# Altium footprint library DD2088PoE_Daisy_Chain.PcbLib: 62 footprints (part 2 of 4)
Each footprint in its own frame and in the unit in brackets; x right, y up, seen from the top. Pads: shape width x height; smd on the part's side, far side on the other; paste and mask are expansions set on the pad; w line width, h text height; cw(c..) or ccw(c..) is an arc to the next point about the centre after c.
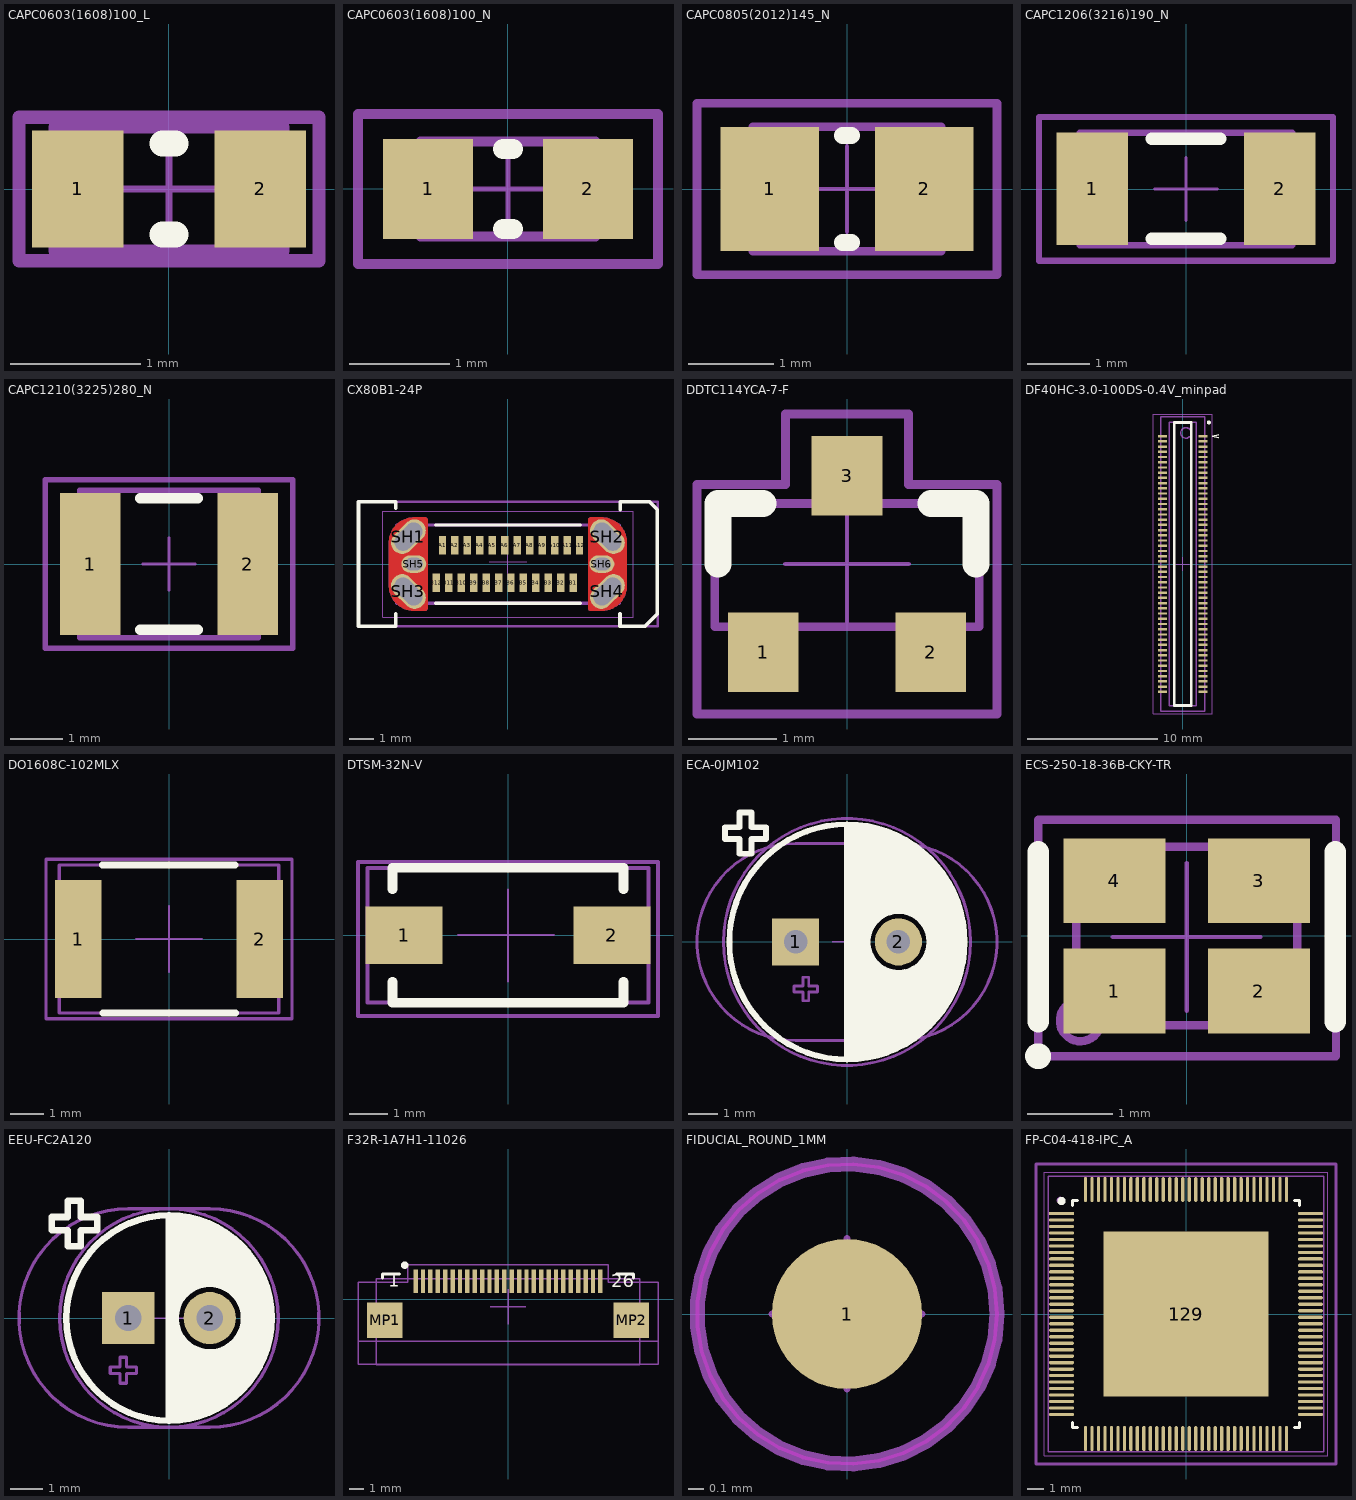
[diagram p1: the footprints below, top view; thin cyan lines are the x and y axes]

## CAPC0603(1608)100_L [mm] "Chip Capacitor, Body 1.6x0.8mm, Height 1.0mm, IPC High Density"
height 1
pads (2):
  rect 0.7x0.9 smd: 1(-0.7,0) 2(0.7,0)
Top Overlay:
  lines w0.2: -0.05,-0.35 0.05,-0.35 ; -0.05,0.35 0.05,0.35
Top Assembly:
  lines w0.1: -1.15,-0.55 -1.15,0.55 1.15,0.55 1.15,-0.55 -1.15,-0.55
  text "'.Designator'" at 0.74,0.283 h1
Top Courtyard:
  lines w0.05: -0.475,0 0.475,0 ; 0,-0.475 0,0.475 ; -1.15,-0.55 1.15,-0.55 1.15,0.55 -1.15,0.55 -1.15,-0.55
Top Component Outline:
  lines w0.1: -0.875,-0.475 -0.875,0.475 0.875,0.475 0.875,-0.475 -0.875,-0.475
3D body: height 1, standoff 0, extent -0.525,-0.475 0.525,0.475
3D body: height 1, standoff 0, extent -0.875,-0.475 -0.525,0.475
3D body: height 1, standoff 0, extent 0.525,-0.475 0.875,0.475

## CAPC0603(1608)100_N [mm] "Chip Capacitor, Body 1.6x0.8mm, Height 1.0mm, IPC Medium Density"
height 1
pads (2):
  rect 0.9x1 smd: 1(-0.8,0) 2(0.8,0)
Top Overlay:
  lines w0.2: -0.05,-0.4 0.05,-0.4 ; -0.05,0.4 0.05,0.4
Top Assembly:
  lines w0.1: -1.5,-0.75 1.5,-0.75 1.5,0.75 -1.5,0.75 -1.5,-0.75
  text "'.Designator'" at -0.8,-0.3 h1
Top Courtyard:
  lines w0.05: -0.475,0 0.475,0 ; 0,-0.475 0,0.475 ; -1.5,-0.75 1.5,-0.75 1.5,0.75 -1.5,0.75 -1.5,-0.75
Top Component Outline:
  lines w0.1: -0.875,-0.475 0.875,-0.475 0.875,0.475 -0.875,0.475 -0.875,-0.475
3D body: height 1, standoff 0, extent -0.525,-0.475 0.525,0.475
3D body: height 1, standoff 0, extent -0.875,-0.475 -0.525,0.475
3D body: height 1, standoff 0, extent 0.525,-0.475 0.875,0.475

## CAPC0805(2012)145_N [mm] "Chip Capacitor, Body 2.0x1.2mm, Height 1.45mm, IPC Medium Density"
height 1.45
pads (2):
  rect 1.15x1.45 smd: 1(-0.9,0) 2(0.9,0)
Top Overlay:
  lines w0.2: -0.05,-0.625 0.05,-0.625 ; -0.05,0.625 0.05,0.625
Top Assembly:
  lines w0.1: -1.75,-1 -1.75,1 1.75,1 1.75,-1 -1.75,-1
  text "'.Designator'" at 0.532,0.307 h1
Top Courtyard:
  lines w0.05: -0.5,0 0.5,0 ; 0,-0.5 0,0.5 ; -1.75,-1 1.75,-1 1.75,1 -1.75,1 -1.75,-1
Top Component Outline:
  lines w0.1: -1.1,-0.725 1.1,-0.725 1.1,0.725 -1.1,0.725 -1.1,-0.725
3D body: height 1.45, standoff 0, extent -0.6,-0.725 0.6,0.725
3D body: height 1.45, standoff 0, extent -1.1,-0.725 -0.6,0.725
3D body: height 1.45, standoff 0, extent 0.6,-0.725 1.1,0.725

## CAPC1206(3216)190_N [mm] "Chip Capacitor, Body 3.2x1.6mm, Height 1.9mm, IPC Medium Density"
height 1.9
pads (2):
  rect 1.15x1.8 smd: 1(-1.5,0) 2(1.5,0)
Top Overlay:
  lines w0.2: -0.55,-0.8 0.55,-0.8 ; -0.55,0.8 0.55,0.8
Top Assembly:
  lines w0.1: -2.35,-1.15 2.35,-1.15 2.35,1.15 -2.35,1.15 -2.35,-1.15
  text "'.Designator'" at -0.875,-0.4 h1
Top Courtyard:
  lines w0.05: -0.5,0 0.5,0 ; 0,-0.5 0,0.5 ; -2.35,-1.15 -2.35,1.15 2.35,1.15 2.35,-1.15 -2.35,-1.15
Top Component Outline:
  lines w0.1: -1.7,-0.9 -1.7,0.9 1.7,0.9 1.7,-0.9 -1.7,-0.9
3D body: height 1.9, standoff 0, extent 1.2,-0.9 1.7,0.9
3D body: height 1.9, standoff 0, extent -1.7,-0.9 -1.2,0.9
3D body: height 1.9, standoff 0, extent -1.2,-0.9 1.2,0.9

## CAPC1210(3225)280_N [mm] "Chip Capacitor, Body 3.2x2.5mm, Height 2.8mm, IPC Medium Density"
height 2.8
pads (2):
  rect 1.15x2.7 smd: 1(-1.5,0) 2(1.5,0)
Top Overlay:
  lines w0.2: -0.55,-1.25 0.55,-1.25 ; -0.55,1.25 0.55,1.25
Top Assembly:
  lines w0.1: -2.35,-1.6 -2.35,1.6 2.35,1.6 2.35,-1.6 -2.35,-1.6
  text "'.Designator'" at -0.3,0.575 h1
Top Courtyard:
  lines w0.05: -0.5,0 0.5,0 ; 0,-0.5 0,0.5 ; -2.35,-1.6 2.35,-1.6 2.35,1.6 -2.35,1.6 -2.35,-1.6
Top Component Outline:
  lines w0.1: -1.7,-1.4 1.7,-1.4 1.7,1.4 -1.7,1.4 -1.7,-1.4
3D body: height 2.8, standoff 0, extent -1.2,-1.4 1.2,1.4
3D body: height 2.8, standoff 0, extent -1.7,-1.4 -1.2,1.4
3D body: height 2.8, standoff 0, extent 1.2,-1.4 1.7,1.4

## CX80B1-24P [mm] "USB3.1 Type-C Molex SMT, Through Hole, Vertical"
height 5
pads (30):
  rect 0.3x0.75 smd: A1(-2.625,0.755) A2(-2.125,0.755) A3(-1.625,0.755) A4(-1.125,0.755) A5(-0.625,0.755) A6(-0.125,0.755) A7(0.375,0.755) A8(0.875,0.755) A9(1.375,0.755) A10(1.875,0.755) A11(2.375,0.755) A12(2.875,0.755) B1(2.625,-0.755) B2(2.125,-0.755) B3(1.625,-0.755) B4(1.125,-0.755) B5(0.625,-0.755) B6(0.125,-0.755) B7(-0.375,-0.755) B8(-0.875,-0.755) B9(-1.375,-0.755) B10(-1.875,-0.755) B11(-2.375,-0.755) B12(-2.875,-0.755)
  oval 1.6x0.9 hole 0.7 slot 1.3 at 45 deg rot 45: SH1(-3.995,1.1) SH4(3.995,-1.1)
  oval 1.6x0.9 hole 0.7 slot 1.3 at 135 deg rot 135: SH2(3.995,1.1) SH3(-3.995,-1.1)
  oval 1x0.7 hole 0.5 slot 0.7 at 0 deg: SH5(-3.775,0) SH6(3.775,0)
Top Layer:
  region: 3.827,1.873 3.88,1.869 3.931,1.862 3.983,1.853 4.034,1.84 4.084,1.826 4.133,1.808 4.182,1.788 4.229,1.766 4.275,1.741 4.32,1.713 4.363,1.684 4.404,1.652 4.444,1.618 4.482,1.582 4.518,1.544 4.552,1.504 4.584,1.462 4.614,1.419 4.641,1.375 4.666,1.329 4.689,1.281 4.709,1.233 4.726,1.184 4.741,1.133 4.753,1.082 4.763,1.031 4.77,0.979 4.774,0.927 4.775,0.875 4.775,-0.875 4.774,-0.928 4.77,-0.98 4.763,-1.032 4.753,-1.083 4.741,-1.134 4.726,-1.185 4.709,-1.234 4.689,-1.282 4.666,-1.329 4.641,-1.375 4.614,-1.42 4.584,-1.463 4.552,-1.505 4.518,-1.545 4.482,-1.583 4.444,-1.619 4.404,-1.653 4.363,-1.685 4.32,-1.714 4.275,-1.742 4.229,-1.766 4.182,-1.789 4.133,-1.809 4.084,-1.827 4.034,-1.841 3.983,-1.854 3.931,-1.863 3.88,-1.87 3.827,-1.874 3.775,-1.875 3.325,-1.875 3.32,-1.875 3.315,-1.875 3.309,-1.874 3.304,-1.873 3.299,-1.872 3.294,-1.871 3.289,-1.869 3.284,-1.867 3.28,-1.865 3.275,-1.862 3.271,-1.859 3.266,-1.856 3.262,-1.853 3.258,-1.85 3.254,-1.846 3.251,-1.842 3.247,-1.838 3.244,-1.834 3.241,-1.83 3.238,-1.825 3.236,-1.821 3.234,-1.816 3.232,-1.811 3.23,-1.806 3.228,-1.801 3.227,-1.796 3.226,-1.791 3.226,-1.786 3.225,-1.781 3.225,-1.775 3.225,1.775 3.225,1.78 3.226,1.785 3.226,1.79 3.227,1.795 3.228,1.8 3.23,1.805 3.232,1.81 3.234,1.815 3.236,1.82 3.238,1.825 3.241,1.829 3.244,1.833 3.247,1.837 3.251,1.841 3.254,1.845 3.258,1.849 3.262,1.852 3.266,1.855 3.271,1.858 3.275,1.861 3.28,1.864 3.284,1.866 3.289,1.868 3.294,1.87 3.299,1.871 3.304,1.872 3.309,1.873 3.315,1.874 3.32,1.874 3.325,1.875 3.775,1.875
  region: -3.32,1.874 -3.315,1.874 -3.309,1.873 -3.304,1.872 -3.299,1.871 -3.294,1.87 -3.289,1.868 -3.284,1.866 -3.28,1.864 -3.275,1.861 -3.271,1.858 -3.266,1.855 -3.262,1.852 -3.258,1.849 -3.254,1.845 -3.251,1.841 -3.247,1.837 -3.244,1.833 -3.241,1.829 -3.238,1.825 -3.236,1.82 -3.234,1.815 -3.232,1.81 -3.23,1.805 -3.228,1.8 -3.227,1.795 -3.226,1.79 -3.226,1.785 -3.225,1.78 -3.225,1.775 -3.225,-1.775 -3.225,-1.781 -3.226,-1.786 -3.226,-1.791 -3.227,-1.796 -3.228,-1.801 -3.23,-1.806 -3.232,-1.811 -3.234,-1.816 -3.236,-1.821 -3.238,-1.825 -3.241,-1.83 -3.244,-1.834 -3.247,-1.838 -3.251,-1.842 -3.254,-1.846 -3.258,-1.85 -3.262,-1.853 -3.266,-1.856 -3.271,-1.859 -3.275,-1.862 -3.28,-1.865 -3.284,-1.867 -3.289,-1.869 -3.294,-1.871 -3.299,-1.872 -3.304,-1.873 -3.309,-1.874 -3.315,-1.875 -3.32,-1.875 -3.325,-1.875 -3.775,-1.875 -3.827,-1.874 -3.88,-1.87 -3.931,-1.863 -3.983,-1.854 -4.034,-1.841 -4.084,-1.827 -4.133,-1.809 -4.182,-1.789 -4.229,-1.766 -4.275,-1.742 -4.32,-1.714 -4.363,-1.685 -4.404,-1.653 -4.444,-1.619 -4.482,-1.583 -4.518,-1.545 -4.552,-1.505 -4.584,-1.463 -4.614,-1.42 -4.641,-1.375 -4.666,-1.329 -4.689,-1.282 -4.709,-1.234 -4.726,-1.185 -4.741,-1.134 -4.753,-1.083 -4.763,-1.032 -4.77,-0.98 -4.774,-0.928 -4.775,-0.875 -4.775,0.875 -4.774,0.927 -4.77,0.979 -4.763,1.031 -4.753,1.082 -4.741,1.133 -4.726,1.184 -4.709,1.233 -4.689,1.281 -4.666,1.329 -4.641,1.375 -4.614,1.419 -4.584,1.462 -4.552,1.504 -4.518,1.544 -4.482,1.582 -4.444,1.618 -4.404,1.652 -4.363,1.684 -4.32,1.713 -4.275,1.741 -4.229,1.766 -4.182,1.788 -4.133,1.808 -4.084,1.826 -4.034,1.84 -3.983,1.853 -3.931,1.862 -3.88,1.869 -3.827,1.873 -3.775,1.875 -3.325,1.875
Bottom Layer:
  region: -3.32,1.874 -3.315,1.874 -3.309,1.873 -3.304,1.872 -3.299,1.871 -3.294,1.87 -3.289,1.868 -3.284,1.866 -3.28,1.864 -3.275,1.861 -3.271,1.858 -3.266,1.855 -3.262,1.852 -3.258,1.849 -3.254,1.845 -3.251,1.841 -3.247,1.837 -3.244,1.833 -3.241,1.829 -3.238,1.825 -3.236,1.82 -3.234,1.815 -3.232,1.81 -3.23,1.805 -3.228,1.8 -3.227,1.795 -3.226,1.79 -3.226,1.785 -3.225,1.78 -3.225,1.775 -3.225,-1.775 -3.225,-1.781 -3.226,-1.786 -3.226,-1.791 -3.227,-1.796 -3.228,-1.801 -3.23,-1.806 -3.232,-1.811 -3.234,-1.816 -3.236,-1.821 -3.238,-1.825 -3.241,-1.83 -3.244,-1.834 -3.247,-1.838 -3.251,-1.842 -3.254,-1.846 -3.258,-1.85 -3.262,-1.853 -3.266,-1.856 -3.271,-1.859 -3.275,-1.862 -3.28,-1.865 -3.284,-1.867 -3.289,-1.869 -3.294,-1.871 -3.299,-1.872 -3.304,-1.873 -3.309,-1.874 -3.315,-1.875 -3.32,-1.875 -3.325,-1.875 -3.775,-1.875 -3.827,-1.874 -3.88,-1.87 -3.931,-1.863 -3.983,-1.854 -4.034,-1.841 -4.084,-1.827 -4.133,-1.809 -4.182,-1.789 -4.229,-1.766 -4.275,-1.742 -4.32,-1.714 -4.363,-1.685 -4.404,-1.653 -4.444,-1.619 -4.482,-1.583 -4.518,-1.545 -4.552,-1.505 -4.584,-1.463 -4.614,-1.42 -4.641,-1.375 -4.666,-1.329 -4.689,-1.282 -4.709,-1.234 -4.726,-1.185 -4.741,-1.134 -4.753,-1.083 -4.763,-1.032 -4.77,-0.98 -4.774,-0.928 -4.775,-0.875 -4.775,0.875 -4.774,0.927 -4.77,0.979 -4.763,1.031 -4.753,1.082 -4.741,1.133 -4.726,1.184 -4.709,1.233 -4.689,1.281 -4.666,1.329 -4.641,1.375 -4.614,1.419 -4.584,1.462 -4.552,1.504 -4.518,1.544 -4.482,1.582 -4.444,1.618 -4.404,1.652 -4.363,1.684 -4.32,1.713 -4.275,1.741 -4.229,1.766 -4.182,1.788 -4.133,1.808 -4.084,1.826 -4.034,1.84 -3.983,1.853 -3.931,1.862 -3.88,1.869 -3.827,1.873 -3.775,1.875 -3.325,1.875
  region: 3.827,1.873 3.88,1.869 3.931,1.862 3.983,1.853 4.034,1.84 4.084,1.826 4.133,1.808 4.182,1.788 4.229,1.766 4.275,1.741 4.32,1.713 4.363,1.684 4.404,1.652 4.444,1.618 4.482,1.582 4.518,1.544 4.552,1.504 4.584,1.462 4.614,1.419 4.641,1.375 4.666,1.329 4.689,1.281 4.709,1.233 4.726,1.184 4.741,1.133 4.753,1.082 4.763,1.031 4.77,0.979 4.774,0.927 4.775,0.875 4.775,-0.875 4.774,-0.928 4.77,-0.98 4.763,-1.032 4.753,-1.083 4.741,-1.134 4.726,-1.185 4.709,-1.234 4.689,-1.282 4.666,-1.329 4.641,-1.375 4.614,-1.42 4.584,-1.463 4.552,-1.505 4.518,-1.545 4.482,-1.583 4.444,-1.619 4.404,-1.653 4.363,-1.685 4.32,-1.714 4.275,-1.742 4.229,-1.766 4.182,-1.789 4.133,-1.809 4.084,-1.827 4.034,-1.841 3.983,-1.854 3.931,-1.863 3.88,-1.87 3.827,-1.874 3.775,-1.875 3.325,-1.875 3.32,-1.875 3.315,-1.875 3.309,-1.874 3.304,-1.873 3.299,-1.872 3.294,-1.871 3.289,-1.869 3.284,-1.867 3.28,-1.865 3.275,-1.862 3.271,-1.859 3.266,-1.856 3.262,-1.853 3.258,-1.85 3.254,-1.846 3.251,-1.842 3.247,-1.838 3.244,-1.834 3.241,-1.83 3.238,-1.825 3.236,-1.821 3.234,-1.816 3.232,-1.811 3.23,-1.806 3.228,-1.801 3.227,-1.796 3.226,-1.791 3.226,-1.786 3.225,-1.781 3.225,-1.775 3.225,1.775 3.225,1.78 3.226,1.785 3.226,1.79 3.227,1.795 3.228,1.8 3.23,1.805 3.232,1.81 3.234,1.815 3.236,1.82 3.238,1.825 3.241,1.829 3.244,1.833 3.247,1.837 3.251,1.841 3.254,1.845 3.258,1.849 3.262,1.852 3.266,1.855 3.271,1.858 3.275,1.861 3.28,1.864 3.284,1.866 3.289,1.868 3.294,1.87 3.299,1.871 3.304,1.872 3.309,1.873 3.315,1.874 3.32,1.874 3.325,1.875 3.775,1.875
Top Overlay:
  lines w0.127: -2.905,-1.57 2.905,-1.57 ; -2.905,1.57 2.905,1.57
  lines w0.15: -4.5,-1.993 -4.5,-2.5 -6,-2.5 -6,2.5 -4.5,2.5 -4.5,2.238 ; 4.502,-1.991 4.502,-2.5 5.506,-2.5 5.591,-2.415 6,-2.006 6,2.186 5.686,2.5 5.601,2.5 4.506,2.5 4.506,2.18
Top Solder:
  drawing of 2 lines, arcs and shapes, not listed
Bottom Solder:
  drawing of 2 lines, arcs and shapes, not listed
Top Assembly:
  lines w0.1: -5.999,-2.506 -5.999,2.501 6.024,2.501 6.024,-2.506 -5.999,-2.506
  text "'.Designator'" at -0.776,-0.315 h1
Top 3D Body:
  lines w0.127: -4.47,-1.57 -4.47,1.57 4.47,1.57 4.47,-1.57 -4.47,-1.57
Top Courtyard:
  lines w0.05: -0.75,0.085 0,0.085 ; 0,-0.665 0,0.085 ; 0,0.835 0,0.085 ; 0.75,0.085 0,0.085 ; -6.018,-2.488 6.012,-2.488 6.012,2.512 -6.018,2.512 -6.018,-2.488 ; -5.025,-2.125 -5.025,2.125 5.025,2.125 5.025,-2.125 -5.025,-2.125
Top Component Outline:
  lines w0.1: -6.01,-2.492 -6.01,2.504 6.027,2.504 6.027,-2.492 -6.01,-2.492
3D body "CX80B1-24P_3D_STEP.stp": height 7.17, standoff -1.05, extent -5.5,-3.365 5.5,3.635

## DDTC114YCA-7-F [mm] "TO-236-3, SC-59, SOT-23-3"
height 1
pads (3):
  rect 0.8x0.9 smd: 1(-0.95,-1) 2(0.95,-1) 3(0,1)
Top Overlay:
  lines w0.305: -1.461,0 -1.461,0.686 -0.953,0.686 ; 0.952,0.686 1.46,0.686 1.46,0
Top Assembly:
  lines w0.1: -1.7,-1.7 1.7,-1.7 1.7,0.9 0.698,0.9 0.698,1.7 -0.698,1.7 -0.698,0.9 -1.7,0.9 -1.7,-1.7
  text "'.Designator'" at -0.296,0.227 h1
Top Courtyard:
  lines w0.05: -0.698,0 0.002,0 ; -0.002,0 0.698,0 ; 0,-0.698 0,0.002 ; 0,0 0,0.7 ; -1.7,-1.7 1.7,-1.7 1.7,0.9 0.698,0.9 0.698,1.7 -0.698,1.7 -0.698,0.9 -1.7,0.9 -1.7,-1.7
Top Component Outline:
  lines w0.1: -1.499,-0.711 -1.499,0.686 1.499,0.686 1.499,-0.711 -1.499,-0.711
3D body: height 1.1, standoff 0, extent -1.5,-0.7 1.5,0.7
3D body: height 0.5, standoff 0, extent -0.15,0.7 0.15,1.1
3D body: height 0.5, standoff 0, extent 0.8,-1.1 1.1,-0.7
3D body: height 0.5, standoff 0, extent -1.1,-1.1 -0.8,-0.7

## DF40HC-3.0-100DS-0.4V_minpad [mm] "3.0MM MATED HEIGHT CONN HDR 100POS 0.4MM SMD GOLD"
height 2.9
pads (100):
  rect 0.7x0.18 smd: 1(1.54,9.8) 2(-1.54,9.8) 3(1.54,9.4) 4(-1.54,9.4) 5(1.54,9) 6(-1.54,9) 7(1.54,8.6) 8(-1.54,8.6) 9(1.54,8.2) 10(-1.54,8.2) 11(1.54,7.8) 12(-1.54,7.8) 13(1.54,7.4) 14(-1.54,7.4) 15(1.54,7) 16(-1.54,7) 17(1.54,6.6) 18(-1.54,6.6) 19(1.54,6.2) 20(-1.54,6.2) 21(1.54,5.8) 22(-1.54,5.8) 23(1.54,5.4) 24(-1.54,5.4) 25(1.54,5) 26(-1.54,5) 27(1.54,4.6) 28(-1.54,4.6) 29(1.54,4.2) 30(-1.54,4.2) 31(1.54,3.8) 32(-1.54,3.8) 33(1.54,3.4) 34(-1.54,3.4) 35(1.54,3) 36(-1.54,3) 37(1.54,2.6) 38(-1.54,2.6) 39(1.54,2.2) 40(-1.54,2.2) 41(1.54,1.8) 42(-1.54,1.8) 43(1.54,1.4) 44(-1.54,1.4) 45(1.54,1) 46(-1.54,1) 47(1.54,0.6) 48(-1.54,0.6) 49(1.54,0.2) 50(-1.54,0.2) 51(1.54,-0.2) 52(-1.54,-0.2) 53(1.54,-0.6) 54(-1.54,-0.6) 55(1.54,-1) 56(-1.54,-1) 57(1.54,-1.4) 58(-1.54,-1.4) 59(1.54,-1.8) 60(-1.54,-1.8) 61(1.54,-2.2) 62(-1.54,-2.2) 63(1.54,-2.6) 64(-1.54,-2.6) 65(1.54,-3) 66(-1.54,-3) 67(1.54,-3.4) 68(-1.54,-3.4) 69(1.54,-3.8) 70(-1.54,-3.8) 71(1.54,-4.2) 72(-1.54,-4.2) 73(1.54,-4.6) 74(-1.54,-4.6) 75(1.54,-5) 76(-1.54,-5) 77(1.54,-5.4) 78(-1.54,-5.4) 79(1.54,-5.8) 80(-1.54,-5.8) 81(1.54,-6.2) 82(-1.54,-6.2) 83(1.54,-6.6) 84(-1.54,-6.6) 85(1.54,-7) 86(-1.54,-7) 87(1.54,-7.4) 88(-1.54,-7.4) 89(1.54,-7.8) 90(-1.54,-7.8) 91(1.54,-8.2) 92(-1.54,-8.2) 93(1.54,-8.6) 94(-1.54,-8.6) 95(1.54,-9) 96(-1.54,-9) 97(1.54,-9.4) 98(-1.54,-9.4) 99(1.54,-9.8) 100(-1.54,-9.8)
Top Overlay:
  circle w0.254: c2,10.85 r0.025
  lines w0.102: 2.75,9.685 2.25,9.8 2.75,9.915
  lines w0.2: -0.65,-10.85 0.65,-10.85 0.65,10.85 -0.65,10.85 -0.65,-10.85
Top Assembly:
  circle w0.1: c0.25,10.05 r0.4
  lines w0.1: -1.05,-10.85 1.05,-10.85 1.05,10.85 -1.05,10.85 -1.05,-10.85
  text "'.Designator'" at -0.4,0.776 h1
Top Courtyard:
  lines w0.05: -0.5,0 0.5,0 ; 0,-0.5 0,0.5 ; -2.25,-11.5 -2.25,11.5 2.25,11.5 2.25,-11.5 -2.25,-11.5
Top Component Outline:
  lines w0.1: -1.69,-11.305 -1.69,11.295 1.69,11.295 1.69,-11.305 -1.69,-11.305
3D body "DF40HC(3.0)-100DS-0.4V.stp": height 2.85, standoff -0.05, extent -1.69,-11.305 1.69,11.295

## DO1608C-102MLX [mm] "Coil inductor 6.6x4.45mm"
height 2.92
pads (2):
  rect 1.4x3.56 smd: 1(-2.73,0) 2(2.73,0)
Top Overlay:
  lines w0.2: -2.007,2.225 1.993,2.225 ; -1.993,-2.225 2.007,-2.225
Top Assembly:
  lines w0.1: -3.7,-2.4 3.7,-2.4 3.7,2.4 -3.7,2.4 -3.7,-2.4
  text "'.Designator'" at -0.27,0.575 h1
Top Courtyard:
  lines w0.05: -1,0 0,0 ; 0,-1 0,0 ; 0,1 0,0 ; 1,0 0,0 ; -3.7,-2.4 3.7,-2.4 3.7,2.4 -3.7,2.4 -3.7,-2.4
Top Component Outline:
  lines w0.1: -3.3,-2.225 3.3,-2.225 3.3,2.225 -3.3,2.225 -3.3,-2.225
3D body "Coilcraft-DO1608C.STEP": height 2.92, standoff -0.01, extent -3.3,-2.225 3.3,2.225

## DTSM-32N-V [mm] "tactile button 160gf"
height 5
pads (2):
  rect 2x1.5 smd: 1(-2.7,0) 2(2.7,0)
Top Overlay:
  lines w0.254: -3.005,-1.209 -3,-1.759 3,-1.759 3,-1.209 ; -3.005,1.75 -3,1.191 ; -3,1.75 3,1.75 3,1.191
Top Assembly:
  lines w0.1: -3.9,-2.1 -3.9,1.9 3.9,1.9 3.9,-2.1 -3.9,-2.1
  text "'.Designator'" at 0.8,0.3 h1
Top Courtyard:
  lines w0.05: -1.3,0 0,0 ; 0,-1.209 0,0 ; 0,1.191 0,0 ; 1.2,0 0,0 ; -3.9,-2.1 -3.9,1.9 3.9,1.9 3.9,-2.1 -3.9,-2.1
Top Component Outline:
  lines w0.1: -3.65,-1.75 -3.65,1.75 3.65,1.75 3.65,-1.75 -3.65,-1.75
3D body "4341x3.stp": height 5, standoff 0, extent -3.65,-1.75 3.65,1.75

## ECA-0JM102 [mm] "Body diameter: 8mm, lead pitch: 3.5mm"
height 16
pads (2):
  rect 1.6x1.6 / inner round 1.6 / far side rect 1.6x1.6 hole 0.8 mask+0.05: 1(-1.75,0)
  round 1.6 hole 0.8 mask+0.05: 2(1.75,0)
Top Overlay:
  circle w0.2: c0,0 r4
  circle w0.1: c1.75,0 r1
  region: 0,4 0,0 0.75,0 0.762,0.104 0.816,0.305 0.909,0.492 1.036,0.658 1.193,0.795 1.373,0.899 1.571,0.966 1.778,0.993 1.882,0.991 1.973,0.977 2.147,0.923 2.308,0.835 2.449,0.718 2.51,0.65 2.567,0.582 2.66,0.431 2.721,0.264 2.749,0.089 2.75,0 4,0 4,0.262 3.932,0.782 3.796,1.289 3.595,1.773 3.333,2.227 3.014,2.643 2.643,3.014 2.227,3.333 1.773,3.595 1.289,3.796 0.782,3.932 0.262,4
  region: 0,-4 0,0 0.75,0 0.759,-0.131 0.826,-0.383 0.957,-0.609 1.141,-0.793 1.367,-0.924 1.619,-0.991 1.881,-0.991 2.133,-0.924 2.359,-0.793 2.543,-0.609 2.674,-0.383 2.741,-0.131 2.75,0 4,0 4,-0.262 3.932,-0.782 3.796,-1.289 3.595,-1.773 3.333,-2.227 3.014,-2.643 2.643,-3.014 2.227,-3.333 1.773,-3.595 1.289,-3.796 0.782,-3.932 0.262,-4
  lines w0.2: -4.15,3.5 -3.65,3.5 -3.65,3 -3.25,3 -3.25,3.5 -2.75,3.5 -2.75,3.9 -3.25,3.9 -3.25,4.4 -3.65,4.4 -3.65,3.9 -4.15,3.9 -4.15,3.5
  lines w0.203: 0,-4 0,4
Top Assembly:
  circle w0.1: c0,0 r4.2
  lines w0.1: -1.8,-1.7 -1.5,-1.7 -1.5,-2 -1.3,-2 -1.3,-1.7 -1,-1.7 -1,-1.5 -1.3,-1.5 -1.3,-1.2 -1.5,-1.2 -1.5,-1.5 -1.8,-1.5 -1.8,-1.7 ; 1,-1.7 1.8,-1.7 1.8,-1.5 1,-1.5 1,-1.7
  text "'.Designator'" at 0,0 h1
Top Courtyard:
  circle w0.05: c0,0 r4.2
  lines w0.05: -0.5,0 0.5,0 ; 0,-0.5 0,0.5
Bottom Courtyard:
  lines w0.1: -1.75,-3.35 cw(c-1.75,0) -1.75,3.35 1.75,3.35 cw(c1.75,0) 1.75,-3.35 -1.75,-3.35
Top Component Outline:
  circle w0.1: c0,0 r4
3D body "ELCO-D8P3.5H11.5LD0.6.stp": height 12.5, standoff -2, extent -4,-4 4,4

## ECS-250-18-36B-CKY-TR [mm] "2.5x2.0mm ceramic SMD"
height 0.6
pads (4):
  rect 1.2x1 smd: 1(-0.85,-0.65) 2(0.85,-0.65) 3(0.85,0.65) 4(-0.85,0.65)
Top Overlay:
  circle w0.254: c-1.748,-1.416 r0.025
  lines w0.254: -1.748,-1.011 -1.748,0.989 ; 1.752,-1.011 1.752,-0.011 1.752,0.989
Top Assembly:
  circle w0.1: c-1.25,-0.998 r0.242
  lines w0.1: -1.748,-1.416 1.759,-1.416 1.759,1.37 -1.748,1.37 -1.748,-1.416
  text "'.Designator'" at -0.776,-0.4 h1
Top Courtyard:
  lines w0.05: -1.748,0.989 -1.748,1.37 ; -0.87,-0.011 0,-0.011 ; 0,-0.881 0,-0.011 ; 0,0.859 0,-0.011 ; 0.87,-0.011 0,-0.011 ; -1.748,1.37 1.759,1.37 1.759,-1.416 -1.748,-1.416 -1.748,1.37
Top Component Outline:
  lines w0.1: -1.3,-1.05 1.3,-1.05 1.3,1.05 -1.3,1.05 -1.3,-1.05
3D body: height 0.6, standoff 0, extent -1.3,-1.05 1.3,1.05

## EEU-FC2A120 [mm] "Body diameter: 6.3mm, lead pitch: 2.5mm"
height 12.2
pads (2):
  rect 1.6x1.6 / inner round 1.6 / far side rect 1.6x1.6 hole 0.8 mask+0.05: 1(-1.25,0)
  round 1.6 hole 0.8 mask+0.05: 2(1.25,0)
Top Overlay:
  circle w0.1: c1.25,0 r1
  circle w0.2: c0,0 r3.15
  region: 0,-3.15 0,0 0.25,0 0.259,-0.131 0.326,-0.383 0.457,-0.609 0.641,-0.793 0.867,-0.924 1.119,-0.991 1.381,-0.991 1.633,-0.924 1.859,-0.793 2.043,-0.609 2.174,-0.383 2.241,-0.131 2.25,0 3.15,0 3.15,-0.206 3.096,-0.616 2.989,-1.015 2.831,-1.396 2.625,-1.754 2.373,-2.081 2.081,-2.373 1.754,-2.625 1.396,-2.831 1.015,-2.989 0.616,-3.096 0.206,-3.15
  region: 0,3.15 0,0 0.25,0 0.259,0.131 0.326,0.383 0.457,0.609 0.641,0.793 0.867,0.924 1.119,0.991 1.381,0.991 1.633,0.924 1.859,0.793 2.043,0.609 2.174,0.383 2.241,0.131 2.25,0 3.15,0 3.15,0.206 3.096,0.616 2.989,1.015 2.831,1.396 2.625,1.754 2.373,2.081 2.081,2.373 1.754,2.625 1.396,2.831 1.015,2.989 0.616,3.096 0.206,3.15
  lines w0.2: -3.6,2.7 -3.6,3.1 -3.1,3.1 -3.1,3.6 -2.7,3.6 -2.7,3.1 -2.2,3.1 -2.2,2.7 -2.7,2.7 -2.7,2.2 -3.1,2.2 -3.1,2.7 -3.6,2.7
  lines w0.203: 0,-3.15 0,3.15
Top Assembly:
  circle w0.1: c0,0 r3.35
  lines w0.1: -1.8,-1.7 -1.8,-1.5 -1.5,-1.5 -1.5,-1.2 -1.3,-1.2 -1.3,-1.5 -1,-1.5 -1,-1.7 -1.3,-1.7 -1.3,-2 -1.5,-2 -1.5,-1.7 -1.8,-1.7 ; 1,-1.7 1,-1.5 1.8,-1.5 1.8,-1.7 1,-1.7
  text "'.Designator'" at 0.45,0.018 h1
Top Courtyard:
  circle w0.05: c0,0 r3.35
  lines w0.05: -0.5,0 0.5,0 ; 0,-0.5 0,0.5
Bottom Courtyard:
  lines w0.1: -1.25,-3.35 cw(c-1.25,0) -1.25,3.35 1.25,3.35 cw(c1.25,0) 1.25,-3.35 -1.25,-3.35
Top Component Outline:
  circle w0.1: c0,0 r3.15
3D body "EC 6.3x11 P2.5 D0.5.STEP": height 12, standoff -0.8, extent -3.15,-3.15 3.15,3.15

## F32R-1A7H1-11026 [mm] "26pin Molex FFC 0.5mm Bottom"
height 1.2
pads (28):
  rect 0.3x1.6 smd: 1(-6.25,1.225) 2(-5.75,1.225) 3(-5.25,1.225) 4(-4.75,1.225) 5(-4.25,1.225) 6(-3.75,1.225) 7(-3.25,1.225) 8(-2.75,1.225) 9(-2.25,1.225) 10(-1.75,1.225) 11(-1.25,1.225) 12(-0.75,1.225) 13(-0.25,1.225) 14(0.25,1.225) 15(0.75,1.225) 16(1.25,1.225) 17(1.75,1.225) 18(2.25,1.225) 19(2.75,1.225) 20(3.25,1.225) 21(3.75,1.225) 22(4.25,1.225) 23(4.75,1.225) 24(5.25,1.225) 25(5.75,1.225) 26(6.25,1.225)
  rect 2.4x2.4 smd: MP1(-8.35,-1.425) MP2(8.35,-1.425)
Top Overlay:
  circle w0.25: c-6.986,2.311 r0.125
  lines w0.2: -8.485,1.451 -8.485,1.705 -7.342,1.705 ; 7.342,1.705 8.485,1.705 8.485,1.451
  text "1" at -8.1,0.55 h1.52
  text "26" at 7,0.5 h1.52
Top Assembly:
  lines w0.1: -10.15,-4.394 10.15,-4.394 10.15,1.143 6.771,1.143 6.771,2.35 -6.771,2.35 -6.771,1.143 -10.15,1.143 -10.15,-4.394
  text "'.Designator'" at -3.302,-1.321 h1.52
Top Courtyard:
  lines w0.1: -10.15,-2.83 10.15,-2.83 ; -1.2,-0.5 0,-0.5 ; 0,-1.7 0,-0.5 ; 0,0.7 0,-0.5 ; 1.2,-0.5 0,-0.5 ; -10.15,-4.394 10.15,-4.394 10.15,1.143 6.771,1.143 6.771,2.35 -6.771,2.35 -6.771,1.143 -10.15,1.143 -10.15,-4.394
Top Component Outline:
  lines w0.1: -8.9,-4.42 8.9,-4.42 8.9,1.397 -8.9,1.397 -8.9,-4.42
3D body "f32r_26pin_asm.stp": height 2.08, standoff -0.02, extent -10.156,-4.475 10.144,1.025

## FIDUCIAL_ROUND_1MM [mm] "Round, 1mm dia"
height 17
pads (1):
  round 1 smd paste-1 mask+0.5: 1(0,0)
Top Layer keep-out:
  circle w0.025: c0,0 r1
Top Assembly:
  circle w0.1: c0,0 r1
  text "'.Designator'" at -0.344,0.869 h1
Top Courtyard:
  circle w0.05: c0,0 r1
  lines w0.05: -0.5,0 0.5,0 ; 0,-0.5 0,0.5

## FP-C04-418-IPC_A [mm]
pads (129):
  rect 1.54x0.2 smd paste+0 mask+0: 1(-7.675,6.2)
  rrect100% 1.54x0.2 smd paste+0 mask+0: 2(-7.675,5.8) 3(-7.675,5.4) 4(-7.675,5) 5(-7.675,4.6) 6(-7.675,4.2) 7(-7.675,3.8) 8(-7.675,3.4) 9(-7.675,3) 10(-7.675,2.6) 11(-7.675,2.2) 12(-7.675,1.8) 13(-7.675,1.4) 14(-7.675,1) 15(-7.675,0.6) 16(-7.675,0.2) 17(-7.675,-0.2) 18(-7.675,-0.6) 19(-7.675,-1) 20(-7.675,-1.4) 21(-7.675,-1.8) 22(-7.675,-2.2) 23(-7.675,-2.6) 24(-7.675,-3) 25(-7.675,-3.4) 26(-7.675,-3.8) 27(-7.675,-4.2) 28(-7.675,-4.6) 29(-7.675,-5) 30(-7.675,-5.4) 31(-7.675,-5.8) 32(-7.675,-6.2) 65(7.675,-6.2) 66(7.675,-5.8) 67(7.675,-5.4) 68(7.675,-5) 69(7.675,-4.6) 70(7.675,-4.2) 71(7.675,-3.8) 72(7.675,-3.4) 73(7.675,-3) 74(7.675,-2.6) 75(7.675,-2.2) 76(7.675,-1.8) 77(7.675,-1.4) 78(7.675,-1) 79(7.675,-0.6) 80(7.675,-0.2) 81(7.675,0.2) 82(7.675,0.6) 83(7.675,1) 84(7.675,1.4) 85(7.675,1.8) 86(7.675,2.2) 87(7.675,2.6) 88(7.675,3) 89(7.675,3.4) 90(7.675,3.8) 91(7.675,4.2) 92(7.675,4.6) 93(7.675,5) 94(7.675,5.4) 95(7.675,5.8) 96(7.675,6.2)
  rrect100% 0.2x1.54 smd paste+0 mask+0: 33(-6.2,-7.675) 34(-5.8,-7.675) 35(-5.4,-7.675) 36(-5,-7.675) 37(-4.6,-7.675) 38(-4.2,-7.675) 39(-3.8,-7.675) 40(-3.4,-7.675) 41(-3,-7.675) 42(-2.6,-7.675) 43(-2.2,-7.675) 44(-1.8,-7.675) 45(-1.4,-7.675) 46(-1,-7.675) 47(-0.6,-7.675) 48(-0.2,-7.675) 49(0.2,-7.675) 50(0.6,-7.675) 51(1,-7.675) 52(1.4,-7.675) 53(1.8,-7.675) 54(2.2,-7.675) 55(2.6,-7.675) 56(3,-7.675) 57(3.4,-7.675) 58(3.8,-7.675) 59(4.2,-7.675) 60(4.6,-7.675) 61(5,-7.675) 62(5.4,-7.675) 63(5.8,-7.675) 64(6.2,-7.675) 97(6.2,7.675) 98(5.8,7.675) 99(5.4,7.675) 100(5,7.675) 101(4.6,7.675) 102(4.2,7.675) 103(3.8,7.675) 104(3.4,7.675) 105(3,7.675) 106(2.6,7.675) 107(2.2,7.675) 108(1.8,7.675) 109(1.4,7.675) 110(1,7.675) 111(0.6,7.675) 112(0.2,7.675) 113(-0.2,7.675) 114(-0.6,7.675) 115(-1,7.675) 116(-1.4,7.675) 117(-1.8,7.675) 118(-2.2,7.675) 119(-2.6,7.675) 120(-3,7.675) 121(-3.4,7.675) 122(-3.8,7.675) 123(-4.2,7.675) 124(-4.6,7.675) 125(-5,7.675) 126(-5.4,7.675) 127(-5.8,7.675) 128(-6.2,7.675)
  rect 10.15x10.15 smd paste-1000 mask+0: 129(0,0)
Top Overlay:
  circle w0.25: c-7.675,6.965 r0.125
  lines w0.2: -7,-6.711 -7,-7 -6.711,-7 ; -7,6.711 -7,7 -6.711,7 ; 6.711,-7 7,-7 7,-6.711 ; 6.711,7 7,7 7,6.711
Top Paste:
  rectangle: 2.724,-4.329 4.329,-2.724
  rectangle: 0.373,-4.329 1.978,-2.724
  rectangle: -1.978,-4.329 -0.373,-2.724
  rectangle: -4.329,-4.329 -2.724,-2.724
  rectangle: 2.724,-1.978 4.329,-0.373
  rectangle: 0.373,-1.978 1.978,-0.373
  rectangle: -1.978,-1.978 -0.373,-0.373
  rectangle: -4.329,-1.978 -2.724,-0.373
  rectangle: 2.724,0.373 4.329,1.978
  rectangle: 0.373,0.373 1.978,1.978
  rectangle: -1.978,0.373 -0.373,1.978
  rectangle: -4.329,0.373 -2.724,1.978
  rectangle: 2.724,2.724 4.329,4.329
  rectangle: 0.373,2.724 1.978,4.329
  rectangle: -1.978,2.724 -0.373,4.329
  rectangle: -4.329,2.724 -2.724,4.329
Top Assembly:
  circle w0.1: c-7.75,7 r0.182
  lines w0.1: -8.5,-8.5 -8.5,8.5 8.5,8.5 8.5,-8.5 -8.5,-8.5
  text ".Designator" at -0.127,0.569 h1
Top Courtyard:
  lines w0.05: -0.5,0 0.5,0 ; 0,-0.5 0,0.5 ; -8.75,-8.75 -8.75,8.75 8.75,8.75 8.75,-8.75 -8.75,-8.75
Bottom Courtyard:
  lines w0.1: -0.5,0 0.5,0 ; 0,-0.5 0,0.5
Top Component Outline:
  lines w0.2: -9.25,-9.25 -9.25,9.25 9.25,9.25 9.25,-9.25 -9.25,-9.25
3D body "User Library-wson6-drv.step": height 0.8, standoff 0, extent -1.01,-1 1.01,1
3D body "IC_Microchip_KSZ9897RTXI-TR_eec.STEP": height 0.25, standoff 0, extent -9.153,-9.153 9.153,9.153